# Altium footprint library Module1.PcbLib: 23 footprints (part 2 of 2)
Each footprint in its own frame and in the unit in brackets; x right, y up, seen from the top. Pads: shape width x height; smd on the part's side, far side on the other; paste and mask are expansions set on the pad; w line width, h text height; cw(c..) or ccw(c..) is an arc to the next point about the centre after c.
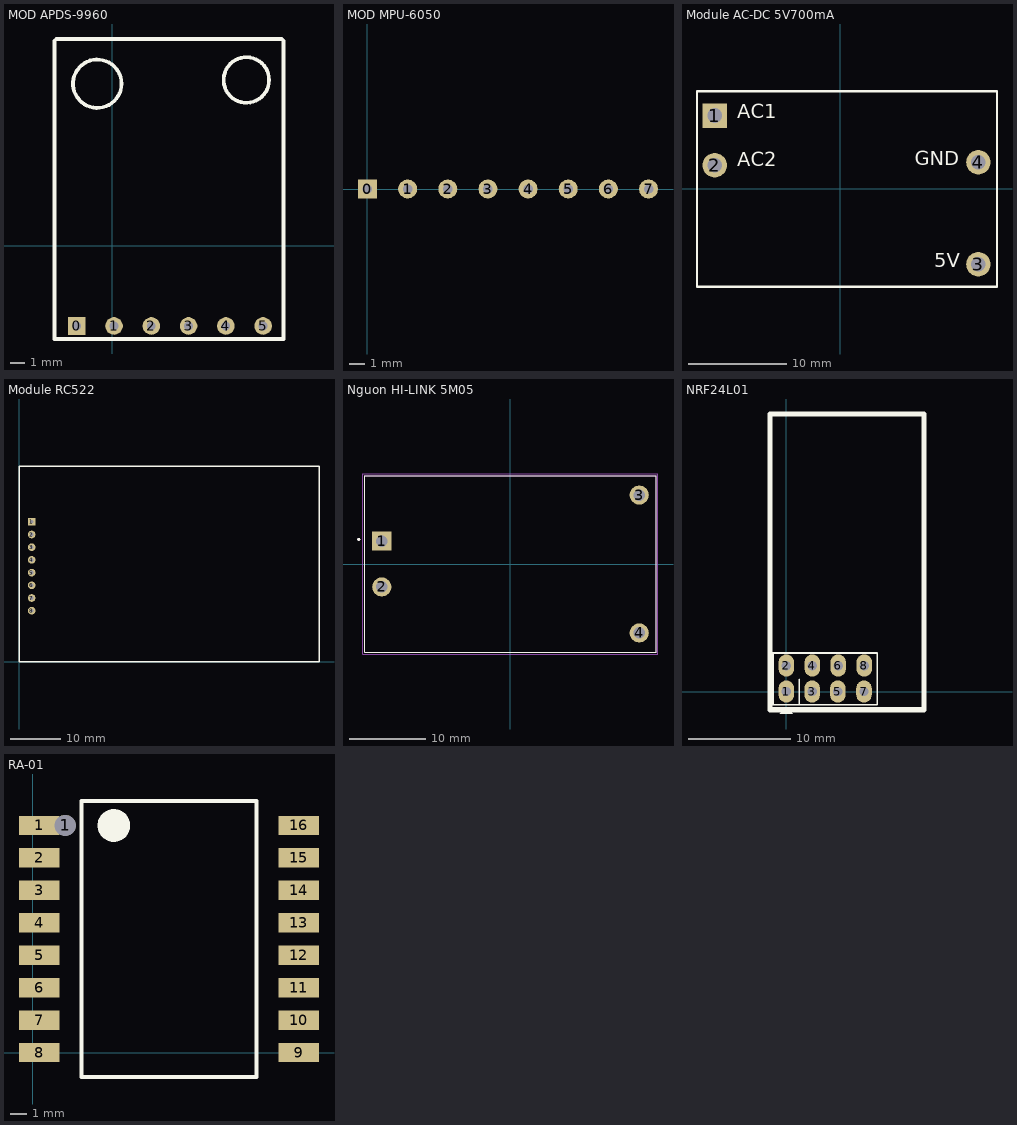
[diagram p1: the footprints below, top view; thin cyan lines are the x and y axes]

## MOD APDS-9960 [mm]
pads (6):
  rect 1.2x1.2 hole 0.6: 0(-2.413,-5.461)
  round 1.2 hole 0.6: 1(0.127,-5.461) 2(2.667,-5.461) 3(5.207,-5.461) 4(7.747,-5.461) 5(10.287,-5.461)
Top Overlay:
  circle w0.254: c9.144,11.303 r1.55
  circle w0.254: c-1.016,11.049 r1.651
  lines w0.254: -3.937,13.97 -3.937,-6.35 11.684,-6.35 11.684,13.97 11.557,14.097 -3.81,14.097
3D body "?????? ???????? ??????, ?????, ??????????? APDS-9960.SLDPRT": height 9.47, standoff -1.88, extent -3.813,-6.35 11.687,14.089

## MOD MPU-6050 [mm]
pads (8):
  rect 1.2x1.2 hole 0.6: 0(0,0)
  round 1.2 hole 0.6: 1(2.54,0) 2(5.08,0) 3(7.62,0) 4(10.16,0) 5(12.7,0) 6(15.24,0) 7(17.78,0)
3D body "ITG-MPU.STEP": height 11.03, standoff -0.72, extent -1.987,-1.524 19.513,14.976

## Module AC-DC 5V700mA [mm]
pads (4):
  rect 2.5x2.5 hole 1.5: 1(-12.83,7.48)
  round 2.5 hole 1.5: 2(-12.83,2.4) 3(14.1,-7.7) 4(14.1,2.7)
Top Overlay:
  lines w0.254: -14.63,-10.02 -14.63,9.98 16,9.98 16,-10.02 -14.63,-10.02
  text "GND" at 7.6,1.9 h2.5
  text "5V" at 9.6,-8.5 h2.5
  text "AC2" at -10.5,1.8 h2.5
  text "AC1" at -10.5,6.7 h2.5

## Module RC522 [mil]
pads (8):
  rect 60x60 hole 30: 1(100,1100)
  round 60 hole 30: 2(100,1000) 3(100,900) 4(100,800) 5(100,700) 6(100,600) 7(100,500) 8(100,400)
Top Overlay:
  lines w10: 0,0 0,1535.43 2362.2,1535.43 2362.2,0 0,0
3D body "RC522 v8.step": height 486.58, standoff -19.68, extent 0,0 2345.67,1537.79

## Nguon HI-LINK 5M05 [mm]
pads (4):
  rect 2.5x2.5 hole 1.5: 1(-16.8,3)
  round 2.5 hole 1.5: 2(-16.8,-3) 3(16.8,9) 4(16.8,-9)
Top Overlay:
  circle w0.2: c-19.8,3.2 r0.1
  lines w0.127: -19,-11.5 -19,11.5 19,11.5 19,-11.5 -19,-11.5
Mechanical 13:
  circle w0.2: c-19.8,3.2 r0.1
  lines w0.127: -19,-11.5 19,-11.5 19,11.5 -19,11.5 -19,-11.5
Mechanical 15:
  lines w0.05: -19.25,-11.75 19.25,-11.75 19.25,11.75 -19.25,11.75 -19.25,-11.75
3D body "HLK-5M05.stp": height 18.01, standoff -3.1, extent -19.077,-11.5 18.923,11.5

## NRF24L01 [mil]
pads (8):
  oval 60x86 hole 36: 1(0,0) 2(0,100) 3(99,0) 4(100,100) 5(198,0) 6(199.5,100) 7(299,0) 8(300,100)
Top Overlay:
  region: -0.5,-61.5 -25.5,-86.5 24.5,-86.5
  lines w7: 49.5,-50.5 49.5,47.5 ; -51,-51 350,-51 350,149 -51,149 -51,49 -51,-51
  lines w20: -63,-70 530,-70 530,1069.2 -63,1069.2 -63,-70
3D body "User Library-MY-NRF24L01P.STEP": height 587.8, standoff 0.73, extent -73,-73.7 517.55,1068.03

## RA-01 [mm]
pads (17):
  rect 2.5x1.2 smd: 1(0.4,14) 2(0.4,12) 3(0.4,10) 4(0.4,8) 5(0.4,6) 6(0.4,4) 7(0.4,2) 8(0.4,0) 9(16.4,0) 10(16.4,2) 11(16.4,4) 12(16.4,6) 13(16.4,8) 14(16.4,10) 15(16.4,12) 16(16.4,14)
  round 1.3 hole 1.3: 1(2,14)
Top Overlay:
  circle w1.016: c5,14 r0.5
  lines w0.254: 3,-1.5 13.8,-1.5 13.8,15.5 3,15.5 3,-1.5